# Altium footprint library SMT.PcbLib: 325 footprints (part 19 of 21)
Each footprint in its own frame and in the unit in brackets; x right, y up, seen from the top. Pads: shape width x height; smd on the part's side, far side on the other; paste and mask are expansions set on the pad; w line width, h text height; cw(c..) or ccw(c..) is an arc to the next point about the centre after c.
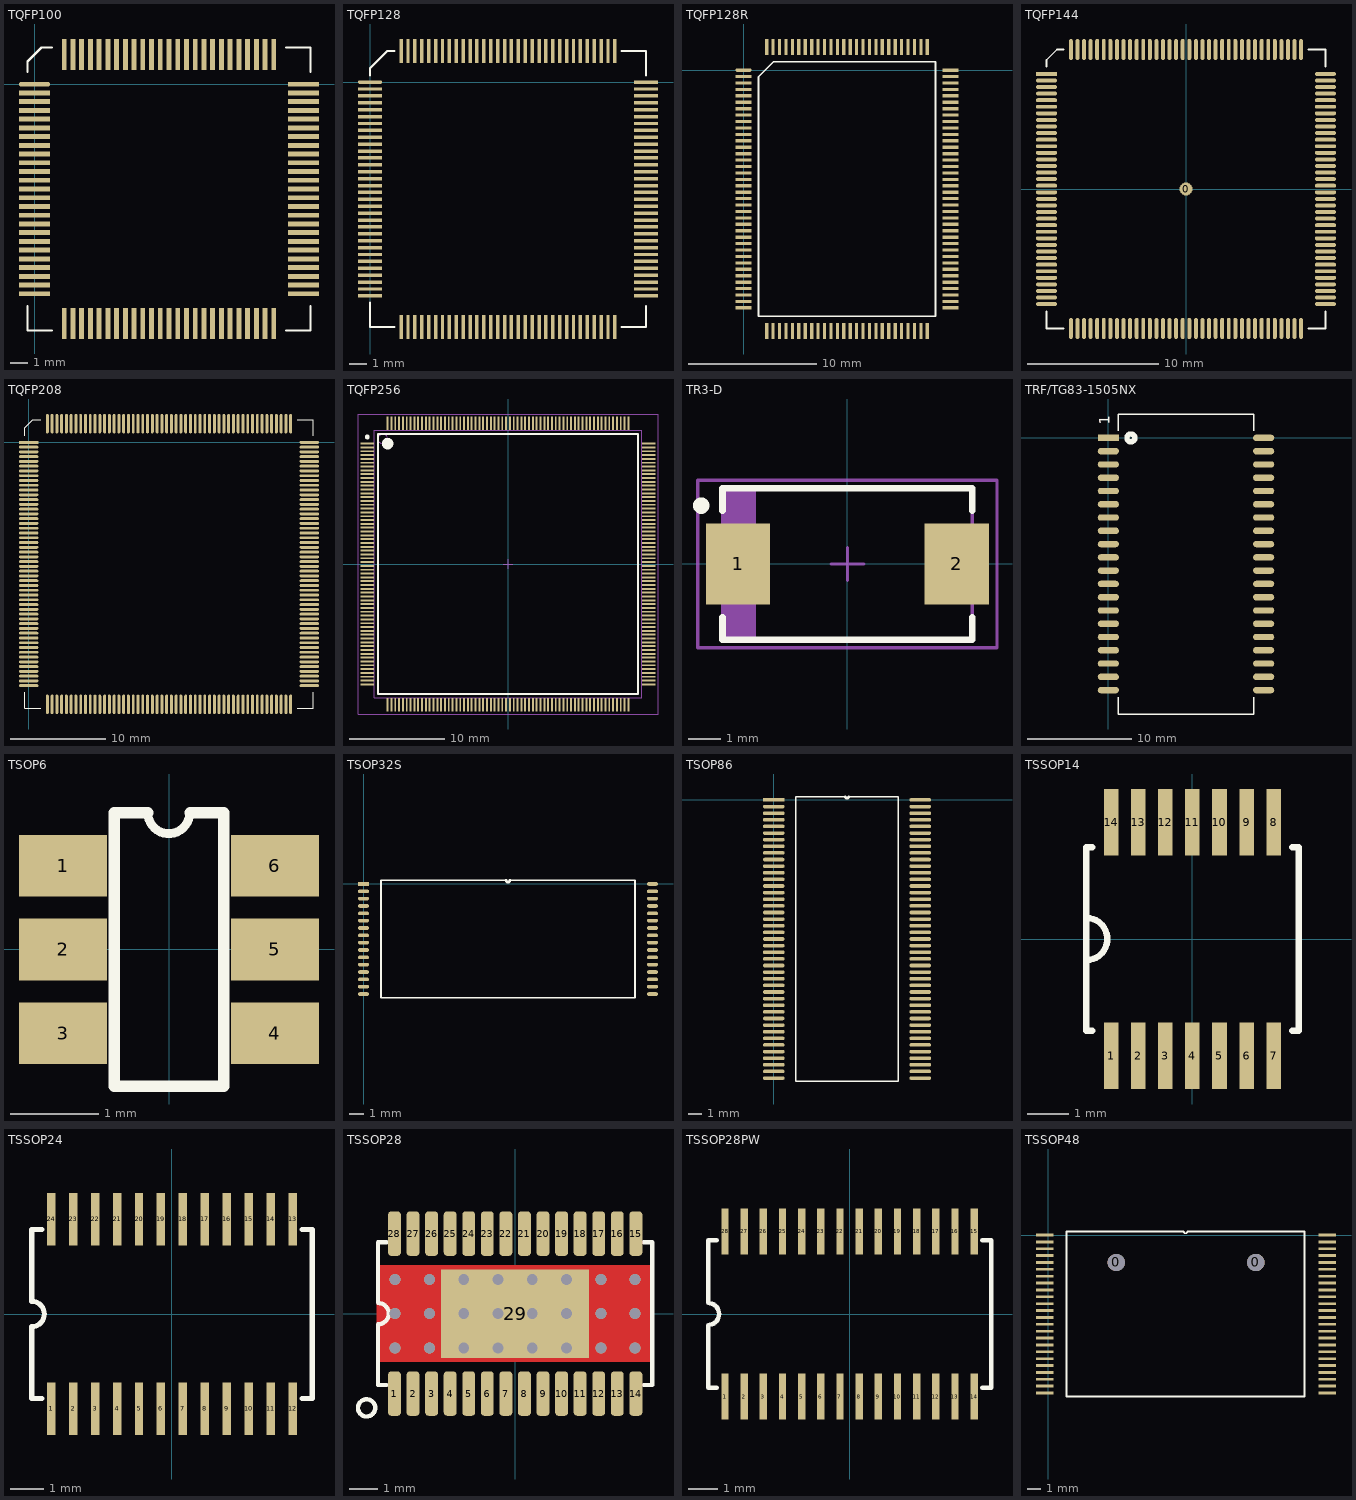
[diagram p18: the footprints below, top view; thin cyan lines are the x and y axes]

## TQFP100 [mil]
pads (100):
  oval 70x11 smd: 1(0,0)
  rect 70x11 smd: 2(0,-19.68) 3(0,-39.37) 4(0,-59.05) 5(0,-78.74) 6(0,-98.42) 7(0,-118.11) 8(0,-137.79) 9(0,-157.48) 10(0,-177.16) 11(0,-196.85) 12(0,-216.53) 13(0,-236.22) 14(0,-255.91) 15(0,-275.59) 16(0,-295.27) 17(0,-314.96) 18(0,-334.64) 19(0,-354.33) 20(0,-374.01) 21(0,-393.7) 22(0,-413.38) 23(0,-433.07) 24(0,-452.75) 25(0,-472.44) 51(606.3,-472.44) 52(606.3,-452.75) 53(606.3,-433.07) 54(606.3,-413.38) 55(606.3,-393.7) 56(606.3,-374.01) 57(606.3,-354.33) 58(606.3,-334.64) 59(606.3,-314.96) 60(606.3,-295.27) 61(606.3,-275.59) 62(606.3,-255.91) 63(606.3,-236.22) 64(606.3,-216.53) 65(606.3,-196.85) 66(606.3,-177.16) 67(606.3,-157.48) 68(606.3,-137.79) 69(606.3,-118.11) 70(606.3,-98.42) 71(606.3,-78.74) 72(606.3,-59.05) 73(606.3,-39.37) 74(606.3,-19.68) 75(606.3,0)
  rect 11x70 smd: 26(66.93,-539.37) 27(86.61,-539.37) 28(106.3,-539.37) 29(125.98,-539.37) 30(145.67,-539.37) 31(165.35,-539.37) 32(185.04,-539.37) 33(204.72,-539.37) 34(224.41,-539.37) 35(244.09,-539.37) 36(263.78,-539.37) 37(283.46,-539.37) 38(303.15,-539.37) 39(322.83,-539.37) 40(342.52,-539.37) 41(362.2,-539.37) 42(381.89,-539.37) 43(401.57,-539.37) 44(421.26,-539.37) 45(440.94,-539.37) 46(460.63,-539.37) 47(480.31,-539.37) 48(500,-539.37) 49(519.68,-539.37) 50(539.37,-539.37) 76(539.37,66.93) 77(519.68,66.93) 78(500,66.93) 79(480.31,66.93) 80(460.63,66.93) 81(440.94,66.93) 82(421.26,66.93) 83(401.57,66.93) 84(381.89,66.93) 85(362.2,66.93) 86(342.52,66.93) 87(322.83,66.93) 88(303.15,66.93) 89(283.46,66.93) 90(263.78,66.93) 91(244.09,66.93) 92(224.41,66.93) 93(204.72,66.93) 94(185.04,66.93) 95(165.35,66.93) 96(145.67,66.93) 97(125.98,66.93) 98(106.3,66.93) 99(86.61,66.93) 100(66.93,66.93)
TopOverlay:
  lines w5: -15.75,-500 -15.75,-555.12 39.37,-555.12 ; -15.75,27.56 -15.75,51.18 15.75,82.68 39.37,82.68 ; 566.93,-555.12 622.05,-555.12 622.05,-500 ; 566.93,82.68 622.05,82.68 622.05,27.56

## TQFP128 [mm]
pads (128):
  oval 1.4x0.2 smd: 1(0,0)
  rect 1.4x0.2 smd: 2(0,-0.4) 3(0,-0.8) 4(0,-1.2) 5(0,-1.6) 6(0,-2) 7(0,-2.4) 8(0,-2.8) 9(0,-3.2) 10(0,-3.6) 11(0,-4) 12(0,-4.4) 13(0,-4.8) 14(0,-5.2) 15(0,-5.6) 16(0,-6) 17(0,-6.4) 18(0,-6.8) 19(0,-7.2) 20(0,-7.6) 21(0,-8) 22(0,-8.4) 23(0,-8.8) 24(0,-9.2) 25(0,-9.6) 26(0,-10) 27(0,-10.4) 28(0,-10.8) 29(0,-11.2) 30(0,-11.6) 31(0,-12) 32(0,-12.4) 65(16,-12.4) 66(16,-12) 67(16,-11.6) 68(16,-11.2) 69(16,-10.8) 70(16,-10.4) 71(16,-10) 72(16,-9.6) 73(16,-9.2) 74(16,-8.8) 75(16,-8.4) 76(16,-8) 77(16,-7.6) 78(16,-7.2) 79(16,-6.8) 80(16,-6.4) 81(16,-6) 82(16,-5.6) 83(16,-5.2) 84(16,-4.8) 85(16,-4.4) 86(16,-4) 87(16,-3.6) 88(16,-3.2) 89(16,-2.8) 90(16,-2.4) 91(16,-2) 92(16,-1.6) 93(16,-1.2) 94(16,-0.8) 95(16,-0.4) 96(16,0)
  rect 0.2x1.4 smd: 33(1.8,-14.2) 34(2.2,-14.2) 35(2.6,-14.2) 36(3,-14.2) 37(3.4,-14.2) 38(3.8,-14.2) 39(4.2,-14.2) 40(4.6,-14.2) 41(5,-14.2) 42(5.4,-14.2) 43(5.8,-14.2) 44(6.2,-14.2) 45(6.6,-14.2) 46(7,-14.2) 47(7.4,-14.2) 48(7.8,-14.2) 49(8.2,-14.2) 50(8.6,-14.2) 51(9,-14.2) 52(9.4,-14.2) 53(9.8,-14.2) 54(10.2,-14.2) 55(10.6,-14.2) 56(11,-14.2) 57(11.4,-14.2) 58(11.8,-14.2) 59(12.2,-14.2) 60(12.6,-14.2) 61(13,-14.2) 62(13.4,-14.2) 63(13.8,-14.2) 64(14.2,-14.2) 97(14.2,1.8) 98(13.8,1.8) 99(13.4,1.8) 100(13,1.8) 101(12.6,1.8) 102(12.2,1.8) 103(11.8,1.8) 104(11.4,1.8) 105(11,1.8) 106(10.6,1.8) 107(10.2,1.8) 108(9.8,1.8) 109(9.4,1.8) 110(9,1.8) 111(8.6,1.8) 112(8.2,1.8) 113(7.8,1.8) 114(7.4,1.8) 115(7,1.8) 116(6.6,1.8) 117(6.2,1.8) 118(5.8,1.8) 119(5.4,1.8) 120(5,1.8) 121(4.6,1.8) 122(4.2,1.8) 123(3.8,1.8) 124(3.4,1.8) 125(3,1.8) 126(2.6,1.8) 127(2.2,1.8) 128(1.8,1.8)
TopOverlay:
  lines w0.127: 0,-12.8 0,-14.2 1.4,-14.2 ; 0,0.4 0,0.8 1,1.8 1.4,1.8 ; 14.6,-14.2 16,-14.2 16,-13 ; 14.6,1.8 16,1.8 16,0.4

## TQFP128R [mm]
pads (128):
  oval 1.25x0.25 smd: 1(0,0)
  rect 1.25x0.25 smd: 2(0,-0.5) 3(0,-1) 4(0,-1.5) 5(0,-2) 6(0,-2.5) 7(0,-3) 8(0,-3.5) 9(0,-4) 10(0,-4.5) 11(0,-5) 12(0,-5.5) 13(0,-6) 14(0,-6.5) 15(0,-7) 16(0,-7.5) 17(0,-8) 18(0,-8.5) 19(0,-9) 20(0,-9.5) 21(0,-10) 22(0,-10.5) 23(0,-11) 24(0,-11.5) 25(0,-12) 26(0,-12.5) 27(0,-13) 28(0,-13.5) 29(0,-14) 30(0,-14.5) 31(0,-15) 32(0,-15.5) 33(0,-16) 34(0,-16.5) 35(0,-17) 36(0,-17.5) 37(0,-18) 38(0,-18.5) 65(16.1,-18.5) 66(16.1,-18) 67(16.1,-17.5) 68(16.1,-17) 69(16.1,-16.5) 70(16.1,-16) 71(16.1,-15.5) 72(16.1,-15) 73(16.1,-14.5) 74(16.1,-14) 75(16.1,-13.5) 76(16.1,-13) 77(16.1,-12.5) 78(16.1,-12) 79(16.1,-11.5) 80(16.1,-11) 81(16.1,-10.5) 82(16.1,-10) 83(16.1,-9.5) 84(16.1,-9) 85(16.1,-8.5) 86(16.1,-8) 87(16.1,-7.5) 88(16.1,-7) 89(16.1,-6.5) 90(16.1,-6) 91(16.1,-5.5) 92(16.1,-5) 93(16.1,-4.5) 94(16.1,-4) 95(16.1,-3.5) 96(16.1,-3) 97(16.1,-2.5) 98(16.1,-2) 99(16.1,-1.5) 100(16.1,-1) 101(16.1,-0.5) 102(16.1,0)
  rect 0.25x1.25 smd: 39(1.8,-20.3) 40(2.3,-20.3) 41(2.8,-20.3) 42(3.3,-20.3) 43(3.8,-20.3) 44(4.3,-20.3) 45(4.8,-20.3) 46(5.3,-20.3) 47(5.8,-20.3) 48(6.3,-20.3) 49(6.8,-20.3) 50(7.3,-20.3) 51(7.8,-20.3) 52(8.3,-20.3) 53(8.8,-20.3) 54(9.3,-20.3) 55(9.8,-20.3) 56(10.3,-20.3) 57(10.8,-20.3) 58(11.3,-20.3) 59(11.8,-20.3) 60(12.3,-20.3) 61(12.8,-20.3) 62(13.3,-20.3) 63(13.8,-20.3) 64(14.3,-20.3) 103(14.3,1.8) 104(13.8,1.8) 105(13.3,1.8) 106(12.8,1.8) 107(12.3,1.8) 108(11.8,1.8) 109(11.3,1.8) 110(10.8,1.8) 111(10.3,1.8) 112(9.8,1.8) 113(9.3,1.8) 114(8.8,1.8) 115(8.3,1.8) 116(7.8,1.8) 117(7.3,1.8) 118(6.8,1.8) 119(6.3,1.8) 120(5.8,1.8) 121(5.3,1.8) 122(4.8,1.8) 123(4.3,1.8) 124(3.8,1.8) 125(3.3,1.8) 126(2.8,1.8) 127(2.3,1.8) 128(1.8,1.8)
TopOverlay:
  lines w0.127: 1.16,-19.14 14.94,-19.14 14.94,0.64 2.32,0.64 1.16,-0.52 1.16,-19.14

## TQFP144 [mm]
pads (145):
  round 1 smd: 0(0,0)
  rect 1.6x0.3 smd: 1(-10.6,8.75)
  oval 1.6x0.3 smd: 2(-10.6,8.25) 3(-10.6,7.75) 4(-10.6,7.25) 5(-10.6,6.75) 6(-10.6,6.25) 7(-10.6,5.75) 8(-10.6,5.25) 9(-10.6,4.75) 10(-10.6,4.25) 11(-10.6,3.75) 12(-10.6,3.25) 13(-10.6,2.75) 14(-10.6,2.25) 15(-10.6,1.75) 16(-10.6,1.25) 17(-10.6,0.75) 18(-10.6,0.25) 19(-10.6,-0.25) 20(-10.6,-0.75) 21(-10.6,-1.25) 22(-10.6,-1.75) 23(-10.6,-2.25) 24(-10.6,-2.75) 25(-10.6,-3.25) 26(-10.6,-3.75) 27(-10.6,-4.25) 28(-10.6,-4.75) 29(-10.6,-5.25) 30(-10.6,-5.75) 31(-10.6,-6.25) 32(-10.6,-6.75) 33(-10.6,-7.25) 34(-10.6,-7.75) 35(-10.6,-8.25) 36(-10.6,-8.75) 73(10.6,-8.75) 74(10.6,-8.25) 75(10.6,-7.75) 76(10.6,-7.25) 77(10.6,-6.75) 78(10.6,-6.25) 79(10.6,-5.75) 80(10.6,-5.25) 81(10.6,-4.75) 82(10.6,-4.25) 83(10.6,-3.75) 84(10.6,-3.25) 85(10.6,-2.75) 86(10.6,-2.25) 87(10.6,-1.75) 88(10.6,-1.25) 89(10.6,-0.75) 90(10.6,-0.25) 91(10.6,0.25) 92(10.6,0.75) 93(10.6,1.25) 94(10.6,1.75) 95(10.6,2.25) 96(10.6,2.75) 97(10.6,3.25) 98(10.6,3.75) 99(10.6,4.25) 100(10.6,4.75) 101(10.6,5.25) 102(10.6,5.75) 103(10.6,6.25) 104(10.6,6.75) 105(10.6,7.25) 106(10.6,7.75) 107(10.6,8.25) 108(10.6,8.75)
  oval 0.3x1.6 smd: 37(-8.75,-10.6) 38(-8.25,-10.6) 39(-7.75,-10.6) 40(-7.25,-10.6) 41(-6.75,-10.6) 42(-6.25,-10.6) 43(-5.75,-10.6) 44(-5.25,-10.6) 45(-4.75,-10.6) 46(-4.25,-10.6) 47(-3.75,-10.6) 48(-3.25,-10.6) 49(-2.75,-10.6) 50(-2.25,-10.6) 51(-1.75,-10.6) 52(-1.25,-10.6) 53(-0.75,-10.6) 54(-0.25,-10.6) 55(0.25,-10.6) 56(0.75,-10.6) 57(1.25,-10.6) 58(1.75,-10.6) 59(2.25,-10.6) 60(2.75,-10.6) 61(3.25,-10.6) 62(3.75,-10.6) 63(4.25,-10.6) 64(4.75,-10.6) 65(5.25,-10.6) 66(5.75,-10.6) 67(6.25,-10.6) 68(6.75,-10.6) 69(7.25,-10.6) 70(7.75,-10.6) 71(8.25,-10.6) 72(8.75,-10.6) 109(8.75,10.6) 110(8.25,10.6) 111(7.75,10.6) 112(7.25,10.6) 113(6.75,10.6) 114(6.25,10.6) 115(5.75,10.6) 116(5.25,10.6) 117(4.75,10.6) 118(4.25,10.6) 119(3.75,10.6) 120(3.25,10.6) 121(2.75,10.6) 122(2.25,10.6) 123(1.75,10.6) 124(1.25,10.6) 125(0.75,10.6) 126(0.25,10.6) 127(-0.25,10.6) 128(-0.75,10.6) 129(-1.25,10.6) 130(-1.75,10.6) 131(-2.25,10.6) 132(-2.75,10.6) 133(-3.25,10.6) 134(-3.75,10.6) 135(-4.25,10.6) 136(-4.75,10.6) 137(-5.25,10.6) 138(-5.75,10.6) 139(-6.25,10.6) 140(-6.75,10.6) 141(-7.25,10.6) 142(-7.75,10.6) 143(-8.25,10.6) 144(-8.75,10.6)
TopOverlay:
  lines w0.127: -10.6,-9.3 -10.6,-10.6 -9.3,-10.6 ; -10.6,9.3 -10.6,9.8 -9.8,10.6 -9.3,10.6 ; 9.3,-10.6 10.6,-10.6 10.6,-9.3 ; 9.3,10.6 10.6,10.6 10.6,9.3

## TQFP208 [mil]
pads (208):
  rect 80x12 smd: 1(0,0)
  oval 80x12 smd: 2(0,-19.68) 3(0,-39.37) 4(0,-59.05) 5(0,-78.74) 6(0,-98.42) 7(0,-118.11) 8(0,-137.79) 9(0,-157.48) 10(0,-177.16) 11(0,-196.85) 12(0,-216.53) 13(0,-236.22) 14(0,-255.91) 15(0,-275.59) 16(0,-295.27) 17(0,-314.96) 18(0,-334.64) 19(0,-354.33) 20(0,-374.01) 21(0,-393.7) 22(0,-413.38) 23(0,-433.07) 24(0,-452.75) 25(0,-472.44) 26(0,-492.12) 27(0,-511.81) 28(0,-531.5) 29(0,-551.18) 30(0,-570.87) 31(0,-590.55) 32(0,-610.24) 33(0,-629.92) 34(0,-649.61) 35(0,-669.29) 36(0,-688.98) 37(0,-708.66) 38(0,-728.35) 39(0,-748.03) 40(0,-767.72) 41(0,-787.4) 42(0,-807.09) 43(0,-826.77) 44(0,-846.46) 45(0,-866.14) 46(0,-885.83) 47(0,-905.51) 48(0,-925.2) 49(0,-944.88) 50(0,-964.57) 51(0,-984.25) 52(0,-1003.93) 105(1157.48,-1003.93) 106(1157.48,-984.25) 107(1157.48,-964.57) 108(1157.48,-944.88) 109(1157.48,-925.2) 110(1157.48,-905.51) 111(1157.48,-885.83) 112(1157.48,-866.14) 113(1157.48,-846.46) 114(1157.48,-826.77) 115(1157.48,-807.09) 116(1157.48,-787.4) 117(1157.48,-767.72) 118(1157.48,-748.03) 119(1157.48,-728.35) 120(1157.48,-708.66) 121(1157.48,-688.98) 122(1157.48,-669.29) 123(1157.48,-649.61) 124(1157.48,-629.92) 125(1157.48,-610.24) 126(1157.48,-590.55) 127(1157.48,-570.87) 128(1157.48,-551.18) 129(1157.48,-531.5) 130(1157.48,-511.81) 131(1157.48,-492.12) 132(1157.48,-472.44) 133(1157.48,-452.75) 134(1157.48,-433.07) 135(1157.48,-413.38) 136(1157.48,-393.7) 137(1157.48,-374.01) 138(1157.48,-354.33) 139(1157.48,-334.64) 140(1157.48,-314.96) 141(1157.48,-295.27) 142(1157.48,-275.59) 143(1157.48,-255.91) 144(1157.48,-236.22) 145(1157.48,-216.53) 146(1157.48,-196.85) 147(1157.48,-177.16) 148(1157.48,-157.48) 149(1157.48,-137.79) 150(1157.48,-118.11) 151(1157.48,-98.42) 152(1157.48,-78.74) 153(1157.48,-59.05) 154(1157.48,-39.37) 155(1157.48,-19.68) 156(1157.48,0)
  oval 12x80 smd: 53(76.77,-1080.71) 54(96.46,-1080.71) 55(116.14,-1080.71) 56(135.83,-1080.71) 57(155.51,-1080.71) 58(175.2,-1080.71) 59(194.88,-1080.71) 60(214.57,-1080.71) 61(234.25,-1080.71) 62(253.94,-1080.71) 63(273.62,-1080.71) 64(293.31,-1080.71) 65(312.99,-1080.71) 66(332.68,-1080.71) 67(352.36,-1080.71) 68(372.05,-1080.71) 69(391.73,-1080.71) 70(411.42,-1080.71) 71(431.1,-1080.71) 72(450.79,-1080.71) 73(470.47,-1080.71) 74(490.16,-1080.71) 75(509.84,-1080.71) 76(529.53,-1080.71) 77(549.21,-1080.71) 78(568.9,-1080.71) 79(588.58,-1080.71) 80(608.27,-1080.71) 81(627.95,-1080.71) 82(647.64,-1080.71) 83(667.32,-1080.71) 84(687.01,-1080.71) 85(706.69,-1080.71) 86(726.38,-1080.71) 87(746.06,-1080.71) 88(765.75,-1080.71) 89(785.43,-1080.71) 90(805.12,-1080.71) 91(824.8,-1080.71) 92(844.49,-1080.71) 93(864.17,-1080.71) 94(883.86,-1080.71) 95(903.54,-1080.71) 96(923.23,-1080.71) 97(942.91,-1080.71) 98(962.6,-1080.71) 99(982.28,-1080.71) 100(1001.97,-1080.71) 101(1021.65,-1080.71) 102(1041.34,-1080.71) 103(1061.02,-1080.71) 104(1080.71,-1080.71) 157(1080.71,76.77) 158(1061.02,76.77) 159(1041.34,76.77) 160(1021.65,76.77) 161(1001.97,76.77) 162(982.28,76.77) 163(962.6,76.77) 164(942.91,76.77) 165(923.23,76.77) 166(903.54,76.77) 167(883.86,76.77) 168(864.17,76.77) 169(844.49,76.77) 170(824.8,76.77) 171(805.12,76.77) 172(785.43,76.77) 173(765.75,76.77) 174(746.06,76.77) 175(726.38,76.77) 176(706.69,76.77) 177(687.01,76.77) 178(667.32,76.77) 179(647.64,76.77) 180(627.95,76.77) 181(608.27,76.77) 182(588.58,76.77) 183(568.9,76.77) 184(549.21,76.77) 185(529.53,76.77) 186(509.84,76.77) 187(490.16,76.77) 188(470.47,76.77) 189(450.79,76.77) 190(431.1,76.77) 191(411.42,76.77) 192(391.73,76.77) 193(372.05,76.77) 194(352.36,76.77) 195(332.68,76.77) 196(312.99,76.77) 197(293.31,76.77) 198(273.62,76.77) 199(253.94,76.77) 200(234.25,76.77) 201(214.57,76.77) 202(194.88,76.77) 203(175.2,76.77) 204(155.51,76.77) 205(135.83,76.77) 206(116.14,76.77) 207(96.46,76.77) 208(76.77,76.77)
TopOverlay:
  lines w5: -15.75,-1031.49 -15.75,-1096.45 49.21,-1096.45 ; -15.75,27.56 -15.75,61.02 15.75,92.52 49.21,92.52 ; 1108.27,-1096.45 1173.23,-1096.45 1173.23,-1031.49 ; 1108.27,92.52 1173.23,92.52 1173.23,27.56

## TQFP256 [mm] "SQFP, 256-Leads, Body 28.00x28.00mm, Pitch 0.40mm, IPC Medium Density"
height 1.7
pads (256):
  rect 1.45x0.2 smd: 1(-14.725,12.6) 2(-14.725,12.2) 3(-14.725,11.8) 4(-14.725,11.4) 5(-14.725,11) 6(-14.725,10.6) 7(-14.725,10.2) 8(-14.725,9.8) 9(-14.725,9.4) 10(-14.725,9) 11(-14.725,8.6) 12(-14.725,8.2) 13(-14.725,7.8) 14(-14.725,7.4) 15(-14.725,7) 16(-14.725,6.6) 17(-14.725,6.2) 18(-14.725,5.8) 19(-14.725,5.4) 20(-14.725,5) 21(-14.725,4.6) 22(-14.725,4.2) 23(-14.725,3.8) 24(-14.725,3.4) 25(-14.725,3) 26(-14.725,2.6) 27(-14.725,2.2) 28(-14.725,1.8) 29(-14.725,1.4) 30(-14.725,1) 31(-14.725,0.6) 32(-14.725,0.2) 33(-14.725,-0.2) 34(-14.725,-0.6) 35(-14.725,-1) 36(-14.725,-1.4) 37(-14.725,-1.8) 38(-14.725,-2.2) 39(-14.725,-2.6) 40(-14.725,-3) 41(-14.725,-3.4) 42(-14.725,-3.8) 43(-14.725,-4.2) 44(-14.725,-4.6) 45(-14.725,-5) 46(-14.725,-5.4) 47(-14.725,-5.8) 48(-14.725,-6.2) 49(-14.725,-6.6) 50(-14.725,-7) 51(-14.725,-7.4) 52(-14.725,-7.8) 53(-14.725,-8.2) 54(-14.725,-8.6) 55(-14.725,-9) 56(-14.725,-9.4) 57(-14.725,-9.8) 58(-14.725,-10.2) 59(-14.725,-10.6) 60(-14.725,-11) 61(-14.725,-11.4) 62(-14.725,-11.8) 63(-14.725,-12.2) 64(-14.725,-12.6) 129(14.725,-12.6) 130(14.725,-12.2) 131(14.725,-11.8) 132(14.725,-11.4) 133(14.725,-11) 134(14.725,-10.6) 135(14.725,-10.2) 136(14.725,-9.8) 137(14.725,-9.4) 138(14.725,-9) 139(14.725,-8.6) 140(14.725,-8.2) 141(14.725,-7.8) 142(14.725,-7.4) 143(14.725,-7) 144(14.725,-6.6) 145(14.725,-6.2) 146(14.725,-5.8) 147(14.725,-5.4) 148(14.725,-5) 149(14.725,-4.6) 150(14.725,-4.2) 151(14.725,-3.8) 152(14.725,-3.4) 153(14.725,-3) 154(14.725,-2.6) 155(14.725,-2.2) 156(14.725,-1.8) 157(14.725,-1.4) 158(14.725,-1) 159(14.725,-0.6) 160(14.725,-0.2) 161(14.725,0.2) 162(14.725,0.6) 163(14.725,1) 164(14.725,1.4) 165(14.725,1.8) 166(14.725,2.2) 167(14.725,2.6) 168(14.725,3) 169(14.725,3.4) 170(14.725,3.8) 171(14.725,4.2) 172(14.725,4.6) 173(14.725,5) 174(14.725,5.4) 175(14.725,5.8) 176(14.725,6.2) 177(14.725,6.6) 178(14.725,7) 179(14.725,7.4) 180(14.725,7.8) 181(14.725,8.2) 182(14.725,8.6) 183(14.725,9) 184(14.725,9.4) 185(14.725,9.8) 186(14.725,10.2) 187(14.725,10.6) 188(14.725,11) 189(14.725,11.4) 190(14.725,11.8) 191(14.725,12.2) 192(14.725,12.6)
  rect 0.2x1.45 smd: 65(-12.6,-14.725) 66(-12.2,-14.725) 67(-11.8,-14.725) 68(-11.4,-14.725) 69(-11,-14.725) 70(-10.6,-14.725) 71(-10.2,-14.725) 72(-9.8,-14.725) 73(-9.4,-14.725) 74(-9,-14.725) 75(-8.6,-14.725) 76(-8.2,-14.725) 77(-7.8,-14.725) 78(-7.4,-14.725) 79(-7,-14.725) 80(-6.6,-14.725) 81(-6.2,-14.725) 82(-5.8,-14.725) 83(-5.4,-14.725) 84(-5,-14.725) 85(-4.6,-14.725) 86(-4.2,-14.725) 87(-3.8,-14.725) 88(-3.4,-14.725) 89(-3,-14.725) 90(-2.6,-14.725) 91(-2.2,-14.725) 92(-1.8,-14.725) 93(-1.4,-14.725) 94(-1,-14.725) 95(-0.6,-14.725) 96(-0.2,-14.725) 97(0.2,-14.725) 98(0.6,-14.725) 99(1,-14.725) 100(1.4,-14.725) 101(1.8,-14.725) 102(2.2,-14.725) 103(2.6,-14.725) 104(3,-14.725) 105(3.4,-14.725) 106(3.8,-14.725) 107(4.2,-14.725) 108(4.6,-14.725) 109(5,-14.725) 110(5.4,-14.725) 111(5.8,-14.725) 112(6.2,-14.725) 113(6.6,-14.725) 114(7,-14.725) 115(7.4,-14.725) 116(7.8,-14.725) 117(8.2,-14.725) 118(8.6,-14.725) 119(9,-14.725) 120(9.4,-14.725) 121(9.8,-14.725) 122(10.2,-14.725) 123(10.6,-14.725) 124(11,-14.725) 125(11.4,-14.725) 126(11.8,-14.725) 127(12.2,-14.725) 128(12.6,-14.725) 193(12.6,14.725) 194(12.2,14.725) 195(11.8,14.725) 196(11.4,14.725) 197(11,14.725) 198(10.6,14.725) 199(10.2,14.725) 200(9.8,14.725) 201(9.4,14.725) 202(9,14.725) 203(8.6,14.725) 204(8.2,14.725) 205(7.8,14.725) 206(7.4,14.725) 207(7,14.725) 208(6.6,14.725) 209(6.2,14.725) 210(5.8,14.725) 211(5.4,14.725) 212(5,14.725) 213(4.6,14.725) 214(4.2,14.725) 215(3.8,14.725) 216(3.4,14.725) 217(3,14.725) 218(2.6,14.725) 219(2.2,14.725) 220(1.8,14.725) 221(1.4,14.725) 222(1,14.725) 223(0.6,14.725) 224(0.2,14.725) 225(-0.2,14.725) 226(-0.6,14.725) 227(-1,14.725) 228(-1.4,14.725) 229(-1.8,14.725) 230(-2.2,14.725) 231(-2.6,14.725) 232(-3,14.725) 233(-3.4,14.725) 234(-3.8,14.725) 235(-4.2,14.725) 236(-4.6,14.725) 237(-5,14.725) 238(-5.4,14.725) 239(-5.8,14.725) 240(-6.2,14.725) 241(-6.6,14.725) 242(-7,14.725) 243(-7.4,14.725) 244(-7.8,14.725) 245(-8.2,14.725) 246(-8.6,14.725) 247(-9,14.725) 248(-9.4,14.725) 249(-9.8,14.725) 250(-10.2,14.725) 251(-10.6,14.725) 252(-11,14.725) 253(-11.4,14.725) 254(-11.8,14.725) 255(-12.2,14.725) 256(-12.6,14.725)
TopOverlay:
  circle w0.25: c-14.725,13.3 r0.125
  circle w0.6: c-12.6,12.6 r0.3
  lines w0.2: -13.6,-13.6 -13.6,13.6 13.6,13.6 13.6,-13.6 -13.6,-13.6
Mechanical13:
  circle w0.1: c-13.1,13.1 r0.5
  lines w0.1: -14,-14 -14,14 14,14 14,-14 -14,-14
Mechanical15:
  lines w0.05: -15.7,-15.7 -15.7,15.7 15.7,15.7 15.7,-15.7 -15.7,-15.7
  lines w0.1: -0.5,0 0.5,0 ; 0,-0.5 0,0.5
3D body: height 1.7, standoff 0.05, extent -14,-14 14,14

## TR3-D [mm] "Molded Capacitor, 2-Leads, Body 7.3x4.3mm, IPC Medium Density"
height 2.8
pads (2):
  rect 1.95x2.45 smd: 1(-3.325,0) 2(3.325,0)
TopOverlay:
  circle w0.25: c-4.45,1.775 r0.125
  lines w0.2: -3.8,-1.625 -3.8,-2.3 3.8,-2.3 3.8,-1.625 ; -3.8,1.625 -3.8,2.3 3.8,2.3 3.8,1.625
Mechanical13:
  rectangle: -3.8,-2.3 -2.778,2.3
  lines w0.1: -3.8,-2.3 3.8,-2.3 3.8,2.3 -3.8,2.3 -3.8,-2.3
Mechanical15:
  lines w0.1: -0.5,0 0.5,0 ; 0,-0.5 0,0.5 ; -4.55,-2.55 4.55,-2.55 4.55,2.55 -4.55,2.55 -4.55,-2.55
3D body: height 2.8, standoff 0, extent -3.8,-2.3 3.8,2.3

## TRF/TG83-1505NX [mil]
pads (40):
  rect 80x24 smd: 1(0,0)
  oval 80x24 smd: 2(-0.25,-50) 3(-0.25,-100) 4(-0.25,-150) 5(-0.25,-200) 6(-0.25,-250) 7(-0.25,-300) 8(-0.25,-350) 9(-0.25,-400) 10(-0.25,-450) 11(-0.25,-500) 12(-0.25,-550) 13(-0.25,-600) 14(-0.25,-650) 15(-0.25,-700) 16(-0.25,-750) 17(-0.25,-800) 18(-0.25,-850) 19(-0.25,-900) 20(-0.25,-950) 21(584.75,-950) 22(584.75,-900) 23(584.75,-850) 24(584.75,-800) 25(584.75,-750) 26(584.75,-700) 27(584.75,-650) 28(584.75,-600) 29(584.75,-550) 30(584.75,-500) 31(584.75,-450) 32(584.75,-400) 33(584.75,-350) 34(584.75,-300) 35(584.75,-250) 36(584.75,-200) 37(584.75,-150) 38(584.75,-100) 39(584.75,-50) 40(584.75,0)
TopOverlay:
  circle w20: c84.75,0 r15
  lines w5: 37.25,-977.5 37.25,-1040 547.25,-1040 547.25,-977.5 ; 37.25,27.5 37.25,90 547.25,90 547.25,27.5
  text "1" at 5,50 h40

## TSOP6 [mm]
pads (6):
  rect 1x0.7 smd: 1(-1.2,0.95) 2(-1.2,0) 3(-1.2,-0.95) 4(1.2,-0.95) 5(1.2,0) 6(1.2,0.95)
TopOverlay:
  lines w0.1: -0.24,1.55 ccw(c-0.002,1.55) 0.235,1.55
  lines w0.127: -0.24,1.55 -0.62,1.55 -0.62,-1.55 0.62,-1.55 0.62,1.55 0.24,1.55
3D body "STEP-WE-TVS-HS-SOT23-6L-rev1.stp": height 1.16, standoff 0, extent -1.4,-1.45 1.4,1.45

## TSOP32S [mil]
pads (32):
  rect 30x10 smd: 1(0,0)
  oval 30x10 smd: 2(0,-20) 3(0,-40) 4(0,-60) 5(0,-80) 6(0,-100) 7(0,-120) 8(0,-140) 9(0,-160) 10(0,-180) 11(0,-200) 12(0,-220) 13(0,-240) 14(0,-260) 15(0,-280) 16(0,-300) 17(787,-300) 18(787,-280) 19(787,-260) 20(787,-240) 21(787,-220) 22(787,-200) 23(787,-180) 24(787,-160) 25(787,-140) 26(787,-120) 27(787,-100) 28(787,-80) 29(787,-60) 30(787,-40) 31(787,-20) 32(787,0)
TopOverlay:
  lines w5: 388.5,10 48,10 48,-310 739,-310 739,10 398.5,10
  lines w8: 388.5,10 ccw(c393.5,10) 398.5,10

## TSOP86 [mm]
pads (86):
  rect 1.65x0.27 smd: 1(0,0)
  oval 1.65x0.27 smd: 2(0,-0.5) 3(0,-1) 4(0,-1.5) 5(0,-2) 6(0,-2.5) 7(0,-3) 8(0,-3.5) 9(0,-4) 10(0,-4.5) 11(0,-5) 12(0,-5.5) 13(0,-6) 14(0,-6.5) 15(0,-7) 16(0,-7.5) 17(0,-8) 18(0,-8.5) 19(0,-9) 20(0,-9.5) 21(0,-10) 22(0,-10.5) 23(0,-11) 24(0,-11.5) 25(0,-12) 26(0,-12.5) 27(0,-13) 28(0,-13.5) 29(0,-14) 30(0,-14.5) 31(0,-15) 32(0,-15.5) 33(0,-16) 34(0,-16.5) 35(0,-17) 36(0,-17.5) 37(0,-18) 38(0,-18.5) 39(0,-19) 40(0,-19.5) 41(0,-20) 42(0,-20.5) 43(0,-21) 44(11.06,-21) 45(11.06,-20.5) 46(11.06,-20) 47(11.06,-19.5) 48(11.06,-19) 49(11.06,-18.5) 50(11.06,-18) 51(11.06,-17.5) 52(11.06,-17) 53(11.06,-16.5) 54(11.06,-16) 55(11.06,-15.5) 56(11.06,-15) 57(11.06,-14.5) 58(11.06,-14) 59(11.06,-13.5) 60(11.06,-13) 61(11.06,-12.5) 62(11.06,-12) 63(11.06,-11.5) 64(11.06,-11) 65(11.06,-10.5) 66(11.06,-10) 67(11.06,-9.5) 68(11.06,-9) 69(11.06,-8.5) 70(11.06,-8) 71(11.06,-7.5) 72(11.06,-7) 73(11.06,-6.5) 74(11.06,-6) 75(11.06,-5.5) 76(11.06,-5) 77(11.06,-4.5) 78(11.06,-4) 79(11.06,-3.5) 80(11.06,-3) 81(11.06,-2.5) 82(11.06,-2) 83(11.06,-1.5) 84(11.06,-1) 85(11.06,-0.5) 86(11.06,0)
TopOverlay:
  lines w0.127: 5.405,0.25 1.66,0.25 1.66,-21.25 9.4,-21.25 9.4,0.25 5.655,0.25
  lines w0.2: 5.405,0.25 ccw(c5.53,0.25) 5.655,0.25

## TSSOP14 [mm] "PW (R-PDS0-G14)"
height 2
pads (14):
  rect 0.35x1.6 smd: 1(-1.95,-2.8) 2(-1.3,-2.8) 3(-0.65,-2.8) 4(0,-2.8) 5(0.65,-2.8) 6(1.3,-2.8) 7(1.95,-2.8) 8(1.95,2.8) 9(1.3,2.8) 10(0.65,2.8) 11(0,2.8) 12(-0.65,2.8) 13(-1.3,2.8) 14(-1.95,2.8)
TopOverlay:
  lines w0.152: -2.55,-0.508 ccw(c-2.55,0) -2.55,0.508 ; -2.4,-2.2 -2.55,-2.2 -2.55,2.2 -2.4,2.2 ; 2.4,-2.2 2.55,-2.2 2.55,2.2 2.4,2.2

## TSSOP24 [mm]
height 77.851
pads (24):
  rect 0.25x1.55 smd: 1(-3.575,-2.8) 2(-2.925,-2.8) 3(-2.275,-2.8) 4(-1.625,-2.8) 5(-0.975,-2.8) 6(-0.325,-2.8) 7(0.325,-2.8) 8(0.975,-2.8) 9(1.625,-2.8) 10(2.275,-2.8) 11(2.925,-2.8) 12(3.575,-2.8) 13(3.575,2.8) 14(2.925,2.8) 15(2.275,2.8) 16(1.625,2.8) 17(0.975,2.8) 18(0.325,2.8) 19(-0.325,2.8) 20(-0.975,2.8) 21(-1.625,2.8) 22(-2.275,2.8) 23(-2.925,2.8) 24(-3.575,2.8)
TopOverlay:
  lines w0.152: -4.15,2.5 -4.15,0.375 cw(c-4.15,0) -4.15,-0.375 -4.15,-2.5 -3.85,-2.5 ; -4.15,2.5 -3.85,2.5 ; 3.85,-2.5 4.15,-2.5 4.15,0 4.15,2.5 3.85,2.5
3D body: height 1.2, standoff 0, extent -4.15,-2.5 4.15,2.5

## TSSOP28 [mm] "TPA3110D2"
height 0.03
pads (29):
  rrect50% 0.45x1.55 smd mask+0.05: 1(-4.225,-2.8) 2(-3.575,-2.8) 3(-2.925,-2.8) 4(-2.275,-2.8) 5(-1.625,-2.8) 6(-0.975,-2.8) 7(-0.325,-2.8) 8(0.325,-2.8) 9(0.975,-2.8) 10(1.625,-2.8) 11(2.275,-2.8) 12(2.925,-2.8) 13(3.575,-2.8) 14(4.225,-2.8) 15(4.225,2.8) 16(3.575,2.8) 17(2.925,2.8) 18(2.275,2.8) 19(1.625,2.8) 20(0.975,2.8) 21(0.325,2.8) 22(-0.325,2.8) 23(-0.975,2.8) 24(-1.625,2.8) 25(-2.275,2.8) 26(-2.925,2.8) 27(-3.575,2.8) 28(-4.225,2.8)
  rect 5.18x3.1 smd mask+0.05: 29(0,0)
via -4.2,0 diameter 0.381 hole 0.381
via 1.8,1.2 diameter 0.381 hole 0.381
via 1.8,0 diameter 0.381 hole 0.381
via 1.8,-1.2 diameter 0.381 hole 0.381
via 3,-1.2 diameter 0.381 hole 0.381
via 3,0 diameter 0.381 hole 0.381
via 3,1.2 diameter 0.381 hole 0.381
via 4.2,-1.2 diameter 0.381 hole 0.381
via 4.2,0 diameter 0.381 hole 0.381
via 4.2,1.2 diameter 0.381 hole 0.381
via 0.6,1.2 diameter 0.381 hole 0.381
via 0.6,0 diameter 0.381 hole 0.381
via 0.6,-1.2 diameter 0.381 hole 0.381
via -0.6,1.2 diameter 0.381 hole 0.381
via -0.6,0 diameter 0.381 hole 0.381
via -0.6,-1.2 diameter 0.381 hole 0.381
via -1.8,1.2 diameter 0.381 hole 0.381
via -1.8,0 diameter 0.381 hole 0.381
via -1.8,-1.2 diameter 0.381 hole 0.381
via -3,1.2 diameter 0.381 hole 0.381
via -3,0 diameter 0.381 hole 0.381
via -3,-1.2 diameter 0.381 hole 0.381
via -4.2,1.2 diameter 0.381 hole 0.381
via -4.2,-1.2 diameter 0.381 hole 0.381
TopLayer:
  rectangle: -4.85,-1.7 4.85,1.7
TopOverlay:
  circle w0.152: c-5.2,-3.3 r0.301
  lines w0.152: -4.8,2.5 -4.8,0.375 cw(c-4.8,0) -4.8,-0.375 -4.8,-2.5 -4.5,-2.5 ; -4.8,2.5 -4.5,2.5 ; 4.5,-2.5 4.8,-2.5 4.8,0 4.8,2.5 4.5,2.5
3D body: height 1.2, standoff 0, extent -4.75,-2.5 4.75,2.5
3D body: height 0.2, standoff 0, extent -4.35,2.921 -4.1,3.277
3D body: height 0.4, standoff 0, extent -4.35,2.769 -4.1,2.921
3D body: height 0.4, standoff 0.2, extent -4.35,2.489 -4.1,2.769
3D body: height 0.2, standoff 0, extent -3.7,2.921 -3.45,3.277
3D body: height 0.4, standoff 0, extent -3.7,2.769 -3.45,2.921
3D body: height 0.4, standoff 0.2, extent -3.7,2.489 -3.45,2.769
3D body: height 0.2, standoff 0, extent -3.05,2.921 -2.8,3.277
3D body: height 0.4, standoff 0, extent -3.05,2.769 -2.8,2.921
3D body: height 0.4, standoff 0.2, extent -3.05,2.489 -2.8,2.769
3D body: height 0.2, standoff 0, extent -2.4,2.921 -2.15,3.277
3D body: height 0.4, standoff 0, extent -2.4,2.769 -2.15,2.921
3D body: height 0.4, standoff 0.2, extent -2.4,2.489 -2.15,2.769
3D body: height 0.2, standoff 0, extent -1.75,2.921 -1.5,3.277
3D body: height 0.4, standoff 0, extent -1.75,2.769 -1.5,2.921
3D body: height 0.4, standoff 0.2, extent -1.75,2.489 -1.5,2.769
3D body: height 0.2, standoff 0, extent -1.1,2.921 -0.85,3.277
3D body: height 0.4, standoff 0, extent -1.1,2.769 -0.85,2.921
3D body: height 0.4, standoff 0.2, extent -1.1,2.489 -0.85,2.769
3D body: height 0.2, standoff 0, extent -0.45,2.921 -0.2,3.277
3D body: height 0.4, standoff 0, extent -0.45,2.769 -0.2,2.921
3D body: height 0.4, standoff 0.2, extent -0.45,2.489 -0.2,2.769
3D body: height 0.2, standoff 0, extent 0.2,2.921 0.45,3.277
3D body: height 0.4, standoff 0, extent 0.2,2.769 0.45,2.921
3D body: height 0.4, standoff 0.2, extent 0.2,2.489 0.45,2.769
3D body: height 0.2, standoff 0, extent 0.85,2.921 1.1,3.277
3D body: height 0.4, standoff 0, extent 0.85,2.769 1.1,2.921
3D body: height 0.4, standoff 0.2, extent 0.85,2.489 1.1,2.769
3D body: height 0.2, standoff 0, extent 1.5,2.921 1.75,3.277
3D body: height 0.4, standoff 0, extent 1.5,2.769 1.75,2.921
3D body: height 0.4, standoff 0.2, extent 1.5,2.489 1.75,2.769
3D body: height 0.2, standoff 0, extent 2.15,2.921 2.4,3.277
3D body: height 0.4, standoff 0, extent 2.15,2.769 2.4,2.921
3D body: height 0.4, standoff 0.2, extent 2.15,2.489 2.4,2.769
3D body: height 0.2, standoff 0, extent 2.8,2.921 3.05,3.277
3D body: height 0.4, standoff 0, extent 2.8,2.769 3.05,2.921
3D body: height 0.4, standoff 0.2, extent 2.8,2.489 3.05,2.769
3D body: height 0.2, standoff 0, extent 3.45,2.921 3.7,3.277
3D body: height 0.4, standoff 0, extent 3.45,2.769 3.7,2.921
3D body: height 0.4, standoff 0.2, extent 3.45,2.489 3.7,2.769
3D body: height 0.4, standoff 0.2, extent 4.1,2.489 4.35,2.769
3D body: height 0.4, standoff 0, extent 4.1,2.769 4.35,2.921
3D body: height 0.2, standoff 0, extent 4.1,2.921 4.35,3.277
3D body: height 0.4, standoff 0.2, extent 4.1,-2.769 4.35,-2.489
3D body: height 0.4, standoff 0, extent 4.1,-2.921 4.35,-2.769
3D body: height 0.2, standoff 0, extent 4.1,-3.277 4.35,-2.921
3D body: height 0.4, standoff 0.2, extent 3.45,-2.769 3.7,-2.489
3D body: height 0.4, standoff 0, extent 3.45,-2.921 3.7,-2.769
3D body: height 0.2, standoff 0, extent 3.45,-3.277 3.7,-2.921
3D body: height 0.4, standoff 0.2, extent 2.8,-2.769 3.05,-2.489
3D body: height 0.4, standoff 0, extent 2.8,-2.921 3.05,-2.769
3D body: height 0.2, standoff 0, extent 2.8,-3.277 3.05,-2.921
3D body: height 0.4, standoff 0.2, extent 2.15,-2.769 2.4,-2.489
3D body: height 0.4, standoff 0, extent 2.15,-2.921 2.4,-2.769
3D body: height 0.2, standoff 0, extent 2.15,-3.277 2.4,-2.921
3D body: height 0.4, standoff 0.2, extent 1.5,-2.769 1.75,-2.489
3D body: height 0.4, standoff 0, extent 1.5,-2.921 1.75,-2.769
3D body: height 0.2, standoff 0, extent 1.5,-3.277 1.75,-2.921
3D body: height 0.4, standoff 0.2, extent 0.85,-2.769 1.1,-2.489
3D body: height 0.4, standoff 0, extent 0.85,-2.921 1.1,-2.769
3D body: height 0.2, standoff 0, extent 0.85,-3.277 1.1,-2.921
3D body: height 0.4, standoff 0.2, extent 0.2,-2.769 0.45,-2.489
3D body: height 0.4, standoff 0, extent 0.2,-2.921 0.45,-2.769
3D body: height 0.2, standoff 0, extent 0.2,-3.277 0.45,-2.921
3D body: height 0.4, standoff 0.2, extent -0.45,-2.769 -0.2,-2.489
3D body: height 0.4, standoff 0, extent -0.45,-2.921 -0.2,-2.769
3D body: height 0.2, standoff 0, extent -0.45,-3.277 -0.2,-2.921
3D body: height 0.4, standoff 0.2, extent -1.1,-2.769 -0.85,-2.489
3D body: height 0.4, standoff 0, extent -1.1,-2.921 -0.85,-2.769
3D body: height 0.2, standoff 0, extent -1.1,-3.277 -0.85,-2.921
3D body: height 0.4, standoff 0.2, extent -1.75,-2.769 -1.5,-2.489
3D body: height 0.4, standoff 0, extent -1.75,-2.921 -1.5,-2.769
3D body: height 0.2, standoff 0, extent -1.75,-3.277 -1.5,-2.921
3D body: height 0.4, standoff 0.2, extent -2.4,-2.769 -2.15,-2.489
3D body: height 0.4, standoff 0, extent -2.4,-2.921 -2.15,-2.769
3D body: height 0.2, standoff 0, extent -2.4,-3.277 -2.15,-2.921
3D body: height 0.4, standoff 0.2, extent -3.05,-2.769 -2.8,-2.489
3D body: height 0.4, standoff 0, extent -3.05,-2.921 -2.8,-2.769
3D body: height 0.2, standoff 0, extent -3.05,-3.277 -2.8,-2.921
3D body: height 0.4, standoff 0.2, extent -3.7,-2.769 -3.45,-2.489
3D body: height 0.4, standoff 0, extent -3.7,-2.921 -3.45,-2.769
3D body: height 0.2, standoff 0, extent -3.7,-3.277 -3.45,-2.921
3D body: height 0.2, standoff 0, extent -4.35,-3.277 -4.1,-2.921
3D body: height 0.4, standoff 0, extent -4.35,-2.921 -4.1,-2.769
3D body: height 0.4, standoff 0.2, extent -4.35,-2.769 -4.1,-2.489

## TSSOP28PW [mm]
pads (28):
  rect 0.25x1.55 smd: 1(-4.225,-2.8) 2(-3.575,-2.8) 3(-2.925,-2.8) 4(-2.275,-2.8) 5(-1.625,-2.8) 6(-0.975,-2.8) 7(-0.325,-2.8) 8(0.325,-2.8) 9(0.975,-2.8) 10(1.625,-2.8) 11(2.275,-2.8) 12(2.925,-2.8) 13(3.575,-2.8) 14(4.225,-2.8) 15(4.225,2.8) 16(3.575,2.8) 17(2.925,2.8) 18(2.275,2.8) 19(1.625,2.8) 20(0.975,2.8) 21(0.325,2.8) 22(-0.325,2.8) 23(-0.975,2.8) 24(-1.625,2.8) 25(-2.275,2.8) 26(-2.925,2.8) 27(-3.575,2.8) 28(-4.225,2.8)
TopOverlay:
  lines w0.152: -4.8,2.5 -4.8,0.375 cw(c-4.8,0) -4.8,-0.375 -4.8,-2.5 -4.5,-2.5 ; -4.8,2.5 -4.5,2.5 ; 4.5,-2.5 4.8,-2.5 4.8,0 4.8,2.5 4.5,2.5
3D body: height 1.2, standoff 0, extent -4.75,-2.5 4.75,2.5
3D body: height 0.2, standoff 0, extent -4.35,-3.277 -4.1,-2.921
3D body: height 0.4, standoff 0, extent -4.35,-2.921 -4.1,-2.769
3D body: height 0.4, standoff 0.2, extent -4.35,-2.769 -4.1,-2.489
3D body: height 0.2, standoff 0, extent -3.7,-3.277 -3.45,-2.921
3D body: height 0.4, standoff 0, extent -3.7,-2.921 -3.45,-2.769
3D body: height 0.4, standoff 0.2, extent -3.7,-2.769 -3.45,-2.489
3D body: height 0.2, standoff 0, extent -3.05,-3.277 -2.8,-2.921
3D body: height 0.4, standoff 0, extent -3.05,-2.921 -2.8,-2.769
3D body: height 0.4, standoff 0.2, extent -3.05,-2.769 -2.8,-2.489
3D body: height 0.2, standoff 0, extent -2.4,-3.277 -2.15,-2.921
3D body: height 0.4, standoff 0, extent -2.4,-2.921 -2.15,-2.769
3D body: height 0.4, standoff 0.2, extent -2.4,-2.769 -2.15,-2.489
3D body: height 0.4, standoff 0.2, extent 0.2,-2.769 0.45,-2.489
3D body: height 0.4, standoff 0, extent 0.2,-2.921 0.45,-2.769
3D body: height 0.2, standoff 0, extent 0.2,-3.277 0.45,-2.921
3D body: height 0.4, standoff 0.2, extent -0.45,-2.769 -0.2,-2.489
3D body: height 0.4, standoff 0, extent -0.45,-2.921 -0.2,-2.769
3D body: height 0.2, standoff 0, extent -0.45,-3.277 -0.2,-2.921
3D body: height 0.4, standoff 0.2, extent -1.1,-2.769 -0.85,-2.489
3D body: height 0.4, standoff 0, extent -1.1,-2.921 -0.85,-2.769
3D body: height 0.2, standoff 0, extent -1.1,-3.277 -0.85,-2.921
3D body: height 0.4, standoff 0.2, extent -1.75,-2.769 -1.5,-2.489
3D body: height 0.4, standoff 0, extent -1.75,-2.921 -1.5,-2.769
3D body: height 0.2, standoff 0, extent -1.75,-3.277 -1.5,-2.921
3D body: height 0.4, standoff 0.2, extent 2.8,-2.769 3.05,-2.489
3D body: height 0.4, standoff 0, extent 2.8,-2.921 3.05,-2.769
3D body: height 0.2, standoff 0, extent 2.8,-3.277 3.05,-2.921
3D body: height 0.4, standoff 0.2, extent 2.15,-2.769 2.4,-2.489
3D body: height 0.4, standoff 0, extent 2.15,-2.921 2.4,-2.769
3D body: height 0.2, standoff 0, extent 2.15,-3.277 2.4,-2.921
3D body: height 0.4, standoff 0.2, extent 1.5,-2.769 1.75,-2.489
3D body: height 0.4, standoff 0, extent 1.5,-2.921 1.75,-2.769
3D body: height 0.2, standoff 0, extent 1.5,-3.277 1.75,-2.921
3D body: height 0.4, standoff 0.2, extent 0.85,-2.769 1.1,-2.489
3D body: height 0.4, standoff 0, extent 0.85,-2.921 1.1,-2.769
3D body: height 0.2, standoff 0, extent 0.85,-3.277 1.1,-2.921
3D body: height 0.4, standoff 0.2, extent 4.1,-2.769 4.35,-2.489
3D body: height 0.4, standoff 0, extent 4.1,-2.921 4.35,-2.769
3D body: height 0.2, standoff 0, extent 4.1,-3.277 4.35,-2.921
3D body: height 0.4, standoff 0.2, extent 3.45,-2.769 3.7,-2.489
3D body: height 0.4, standoff 0, extent 3.45,-2.921 3.7,-2.769
3D body: height 0.2, standoff 0, extent 3.45,-3.277 3.7,-2.921
3D body: height 0.4, standoff 0.2, extent 2.15,2.489 2.4,2.769
3D body: height 0.4, standoff 0, extent 2.15,2.769 2.4,2.921
3D body: height 0.2, standoff 0, extent 2.15,2.921 2.4,3.277
3D body: height 0.4, standoff 0.2, extent 2.8,2.489 3.05,2.769
3D body: height 0.4, standoff 0, extent 2.8,2.769 3.05,2.921
3D body: height 0.2, standoff 0, extent 2.8,2.921 3.05,3.277
3D body: height 0.4, standoff 0.2, extent 3.45,2.489 3.7,2.769
3D body: height 0.4, standoff 0, extent 3.45,2.769 3.7,2.921
3D body: height 0.2, standoff 0, extent 3.45,2.921 3.7,3.277
3D body: height 0.4, standoff 0.2, extent 4.1,2.489 4.35,2.769
3D body: height 0.4, standoff 0, extent 4.1,2.769 4.35,2.921
3D body: height 0.2, standoff 0, extent 4.1,2.921 4.35,3.277
3D body: height 0.4, standoff 0.2, extent -0.45,2.489 -0.2,2.769
3D body: height 0.4, standoff 0, extent -0.45,2.769 -0.2,2.921
3D body: height 0.2, standoff 0, extent -0.45,2.921 -0.2,3.277
3D body: height 0.4, standoff 0.2, extent 0.2,2.489 0.45,2.769
3D body: height 0.4, standoff 0, extent 0.2,2.769 0.45,2.921
3D body: height 0.2, standoff 0, extent 0.2,2.921 0.45,3.277
3D body: height 0.4, standoff 0.2, extent 0.85,2.489 1.1,2.769
3D body: height 0.4, standoff 0, extent 0.85,2.769 1.1,2.921
3D body: height 0.2, standoff 0, extent 0.85,2.921 1.1,3.277
3D body: height 0.4, standoff 0.2, extent 1.5,2.489 1.75,2.769
3D body: height 0.4, standoff 0, extent 1.5,2.769 1.75,2.921
3D body: height 0.2, standoff 0, extent 1.5,2.921 1.75,3.277
3D body: height 0.4, standoff 0.2, extent -3.05,2.489 -2.8,2.769
3D body: height 0.4, standoff 0, extent -3.05,2.769 -2.8,2.921
3D body: height 0.2, standoff 0, extent -3.05,2.921 -2.8,3.277
3D body: height 0.4, standoff 0.2, extent -2.4,2.489 -2.15,2.769
3D body: height 0.4, standoff 0, extent -2.4,2.769 -2.15,2.921
3D body: height 0.2, standoff 0, extent -2.4,2.921 -2.15,3.277
3D body: height 0.4, standoff 0.2, extent -1.75,2.489 -1.5,2.769
3D body: height 0.4, standoff 0, extent -1.75,2.769 -1.5,2.921
3D body: height 0.2, standoff 0, extent -1.75,2.921 -1.5,3.277
3D body: height 0.4, standoff 0.2, extent -1.1,2.489 -0.85,2.769
3D body: height 0.4, standoff 0, extent -1.1,2.769 -0.85,2.921
3D body: height 0.2, standoff 0, extent -1.1,2.921 -0.85,3.277
3D body: height 0.4, standoff 0.2, extent -4.35,2.489 -4.1,2.769
3D body: height 0.4, standoff 0, extent -4.35,2.769 -4.1,2.921
3D body: height 0.2, standoff 0, extent -4.35,2.921 -4.1,3.277
3D body: height 0.4, standoff 0.2, extent -3.7,2.489 -3.45,2.769
3D body: height 0.4, standoff 0, extent -3.7,2.769 -3.45,2.921
3D body: height 0.2, standoff 0, extent -3.7,2.921 -3.45,3.277

## TSSOP48 [mm]
pads (50):
  round 1.27 hole 1.27: 0(4.953,-2) 0(15.113,-2)
  rect 1.27x0.2 smd: 1(-0.254,0) 2(-0.254,-0.5) 3(-0.254,-1) 4(-0.254,-1.5) 5(-0.254,-2) 6(-0.254,-2.5) 7(-0.254,-3) 8(-0.254,-3.5) 9(-0.254,-4) 10(-0.254,-4.5) 11(-0.254,-5) 12(-0.254,-5.5) 13(-0.254,-6) 14(-0.254,-6.5) 15(-0.254,-7) 16(-0.254,-7.5) 17(-0.254,-8) 18(-0.254,-8.5) 19(-0.254,-9) 20(-0.254,-9.5) 21(-0.254,-10) 22(-0.254,-10.5) 23(-0.254,-11) 24(-0.254,-11.5) 25(20.315,-11.5) 26(20.315,-11) 27(20.315,-10.5) 28(20.315,-10) 29(20.315,-9.5) 30(20.315,-9) 31(20.315,-8.5) 32(20.315,-8) 33(20.315,-7.5) 34(20.315,-7) 35(20.315,-6.5) 36(20.315,-6) 37(20.315,-5.5) 38(20.315,-5) 39(20.315,-4.5) 40(20.315,-4) 41(20.315,-3.5) 42(20.315,-3) 43(20.315,-2.5) 44(20.315,-2) 45(20.315,-1.5) 46(20.315,-1) 47(20.315,-0.5) 48(20.315,0)
TopOverlay:
  lines w0.127: 1.335,-11.75 1.335,0.25 9.875,0.25 ccw(c10,0.25) 10.125,0.25 18.665,0.25 18.665,-11.75 1.335,-11.75